# Altium footprint library Miscellaneous THD.PcbLib: 216 footprints (part 12 of 15)
Each footprint in its own frame and in the unit in brackets; x right, y up, seen from the top. Pads: shape width x height; smd on the part's side, far side on the other; paste and mask are expansions set on the pad; w line width, h text height; cw(c..) or ccw(c..) is an arc to the next point about the centre after c.
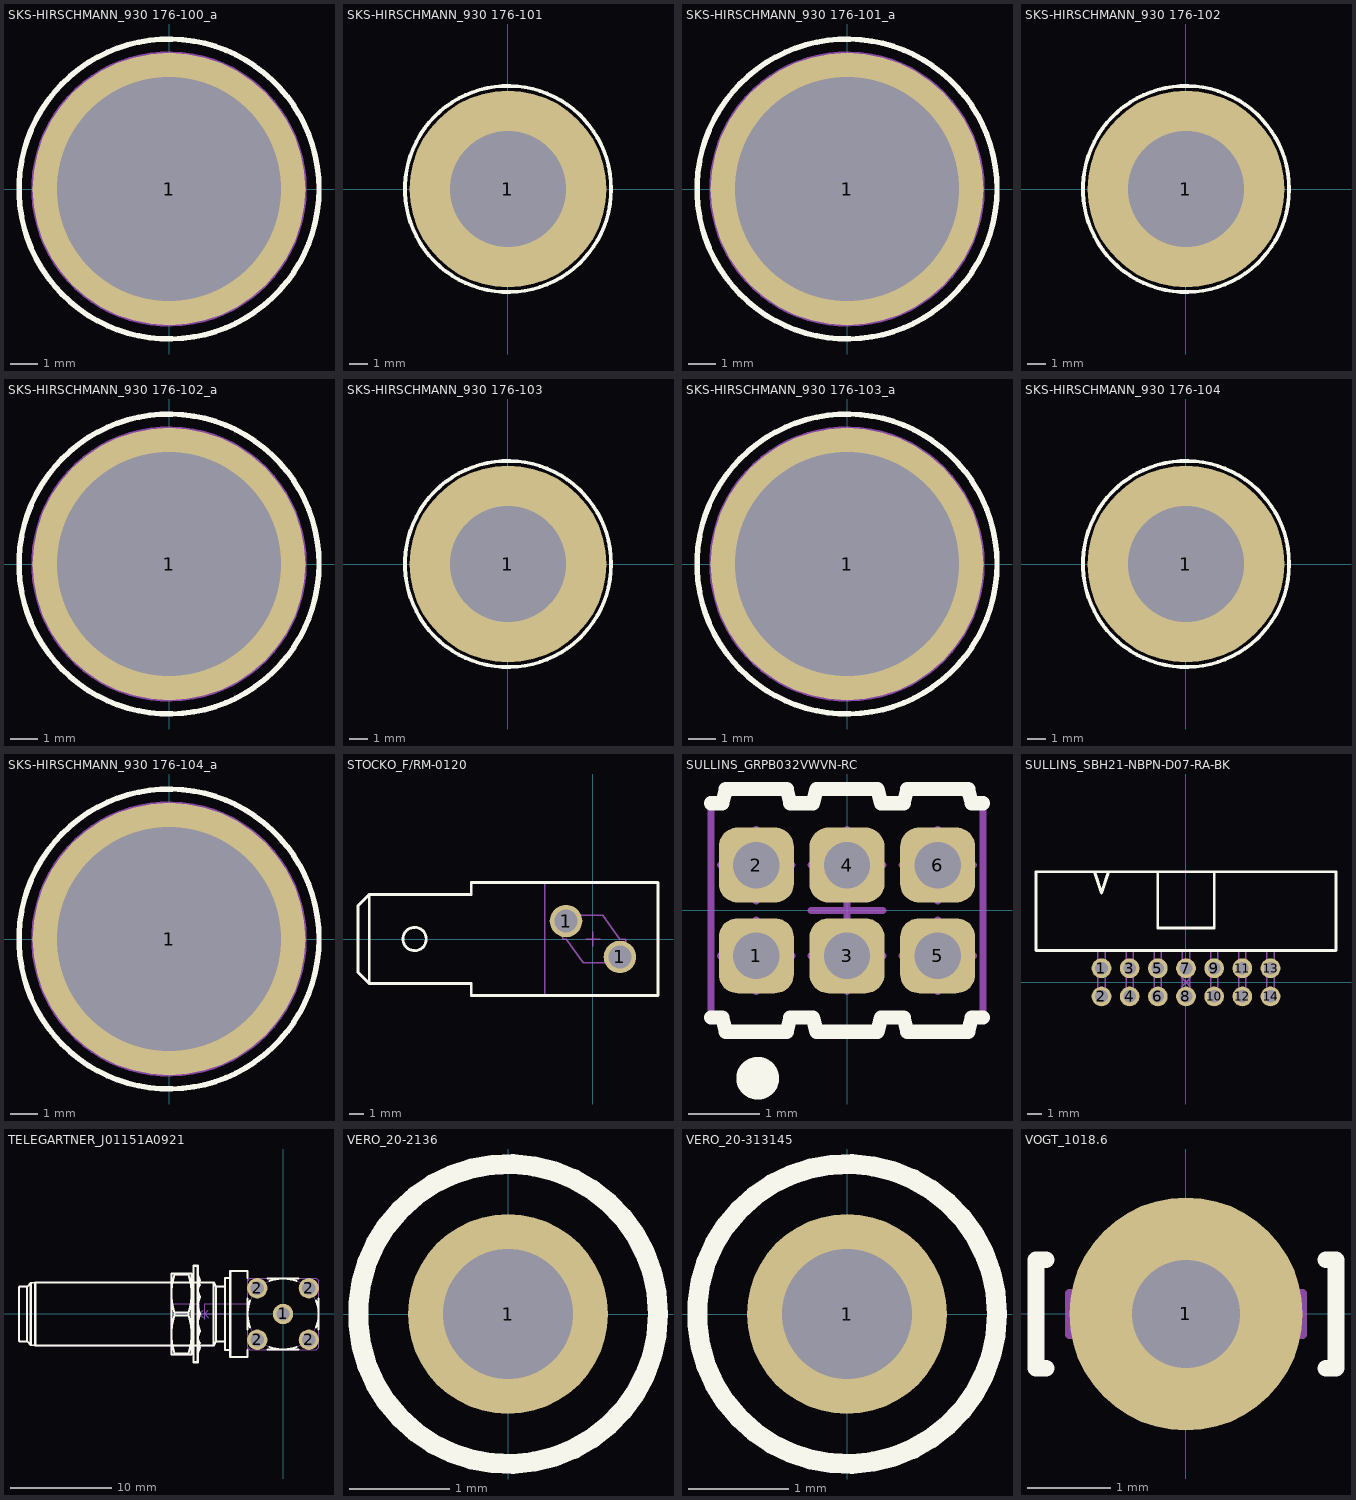
[diagram p11: the footprints below, top view; thin cyan lines are the x and y axes]

## SKS-HIRSCHMANN_930 176-100_a [mm] "Black Socket For Banana 4mm"
height 5
pads (1):
  round 10 hole 8.2: 1(0,0)
Top Overlay:
  circle w0.2: c0,0 r5.5
Mechanical 14:
  circle w0.1: c0,0 r5
  circle w0.1: c0,0 r2
  circle w0.1: c0.003,-0.002 r3
3D body "SKS-HIRSCHMANN_930 176-100_a_Part1.stp": height 5, standoff -18.5, extent -5,-4.997 5,4.997
3D body "SKS-HIRSCHMANN_930 176-100_a_Part2.stp": height -1.6, standoff -9.9, extent -5,-4.999 5,4.999

## SKS-HIRSCHMANN_930 176-101 [mm] "Red Socket For Banana 4mm"
height 9.3
pads (1):
  round 10.5 hole 6.2: 1(0,0)
Top Overlay:
  circle w0.2: c0,0 r5.5
Bottom Overlay:
  circle w0.2: c0,0 r8
Mechanical 14:
  circle w0.1: c0.003,-0.002 r3
  circle w0.1: c0,0 r2
  circle w0.1: c0,0 r5
3D body "SKS-HIRSCHMANN_930 176-101_Part1.stp": height 9.3, standoff -14.2, extent -5,-4.997 5,4.997
3D body "SKS-HIRSCHMANN_930 176-101_Part2.stp": height -1.6, standoff -5.6, extent -4.347,-4.5 4.347,4.5

## SKS-HIRSCHMANN_930 176-101_a [mm] "Red Socket For Banana 4mm"
height 5
pads (1):
  round 10 hole 8.2: 1(0,0)
Top Overlay:
  circle w0.2: c0,0 r5.5
Mechanical 14:
  circle w0.1: c0.003,-0.002 r3
  circle w0.1: c0,0 r2
  circle w0.1: c0,0 r5
3D body "SKS-HIRSCHMANN_930 176-101_a_Part1.stp": height 5, standoff -18.5, extent -5,-4.997 5,4.997
3D body "SKS-HIRSCHMANN_930 176-101_a_Part2.stp": height -1.6, standoff -9.9, extent -5,-4.999 5,4.999

## SKS-HIRSCHMANN_930 176-102 [mm] "Blue Socket For Banana 4mm"
height 9.3
pads (1):
  round 10.5 hole 6.2: 1(0,0)
Top Overlay:
  circle w0.2: c0,0 r5.5
Bottom Overlay:
  circle w0.2: c0,0 r8
Mechanical 14:
  circle w0.1: c0,0 r5
  circle w0.1: c0,0 r2
  circle w0.1: c0.002,0.003 r3
3D body "SKS-HIRSCHMANN_930 176-102_Part1.stp": height 9.3, standoff -14.2, extent -5,-4.997 5,4.997
3D body "SKS-HIRSCHMANN_930 176-102_Part2.stp": height -1.6, standoff -5.6, extent -4.347,-4.5 4.347,4.5

## SKS-HIRSCHMANN_930 176-102_a [mm] "Blue Socket For Banana 4mm"
height 5
pads (1):
  round 10 hole 8.2: 1(0,0)
Top Overlay:
  circle w0.2: c0,0 r5.5
Mechanical 14:
  circle w0.1: c0,0 r5
  circle w0.1: c0,0 r2
  circle w0.1: c0.003,-0.002 r3
3D body "SKS-HIRSCHMANN_930 176-102_a_Part1.stp": height 5, standoff -18.5, extent -5,-4.997 5,4.997
3D body "SKS-HIRSCHMANN_930 176-102_a_Part2.stp": height -1.6, standoff -9.9, extent -5,-4.999 5,4.999

## SKS-HIRSCHMANN_930 176-103 [mm] "Yellow Socket For Banana 4mm"
height 9.3
pads (1):
  round 10.5 hole 6.2: 1(0,0)
Top Overlay:
  circle w0.2: c0,0 r5.5
Bottom Overlay:
  circle w0.2: c0,0 r8
Mechanical 14:
  circle w0.1: c0.002,0.003 r3
  circle w0.1: c0,0 r2
  circle w0.1: c0,0 r5
3D body "SKS-HIRSCHMANN_930 176-103_Part2.stp": height -1.6, standoff -5.6, extent -4.347,-4.5 4.347,4.5
3D body "SKS-HIRSCHMANN_930 176-103_Part1.stp": height 9.3, standoff -14.2, extent -5,-4.997 5,4.997

## SKS-HIRSCHMANN_930 176-103_a [mm] "Yellow Socket For Banana 4mm"
height 5
pads (1):
  round 10 hole 8.2: 1(0,0)
Top Overlay:
  circle w0.2: c0,0 r5.5
Mechanical 14:
  circle w0.1: c0,0 r5
  circle w0.1: c0,0 r2
  circle w0.1: c0.003,-0.002 r3
3D body "SKS-HIRSCHMANN_930 176-103_a_Part2.stp": height -1.6, standoff -9.9, extent -5,-4.999 5,4.999
3D body "SKS-HIRSCHMANN_930 176-103_a_Part1.stp": height 5, standoff -18.5, extent -5,-4.997 5,4.997

## SKS-HIRSCHMANN_930 176-104 [mm] "Green Socket For Banana 4mm"
height 9.3
pads (1):
  round 10.5 hole 6.2: 1(0,0)
Top Overlay:
  circle w0.2: c0,0 r5.5
Bottom Overlay:
  circle w0.2: c0,0 r8
Mechanical 14:
  circle w0.1: c0.002,0.003 r3
  circle w0.1: c0,0 r2
  circle w0.1: c0,0 r5
3D body "SKS-HIRSCHMANN_930 176-104_Part2.stp": height -1.6, standoff -5.6, extent -4.347,-4.5 4.347,4.5
3D body "SKS-HIRSCHMANN_930 176-104_Part1.stp": height 9.3, standoff -14.2, extent -5,-4.997 5,4.997

## SKS-HIRSCHMANN_930 176-104_a [mm] "Green Socket For Banana 4mm"
height 5
pads (1):
  round 10 hole 8.2: 1(0,0)
Top Overlay:
  circle w0.2: c0,0 r5.5
Mechanical 14:
  circle w0.1: c0,0 r5
  circle w0.1: c0,0 r2
  circle w0.1: c0.003,-0.002 r3
3D body "SKS-HIRSCHMANN_930 176-104_a_Part2.stp": height -1.6, standoff -9.9, extent -5,-4.999 5,4.999
3D body "SKS-HIRSCHMANN_930 176-104_a_Part1.stp": height 5, standoff -18.5, extent -5,-4.997 5,4.997

## STOCKO_F/RM-0120 [mm] "6.35mm x 0.8mm PCB Horizontal Terminal Tab"
height 2.8
pads (2):
  round 2.3 hole 1.6: 1(-1.905,1.27) 1(1.905,-1.27)
Top Overlay:
  circle w0.2: c-12.605,0 r0.825
  lines w0.2: -15.805,-3.15 -15.805,3.15 ; -15.805,-3.15 -8.605,-3.15 -8.605,-4 4.595,-4 4.595,4 -8.605,4 -8.605,3.15 -15.805,3.15 ; -15.805,-3.15 -16.605,-2.35 -16.605,2.35 -15.805,3.15
Mechanical 8:
  lines w0.1: -2.405,1.27 -1.905,1.27 ; -1.905,0.77 -1.905,1.27 ; -1.905,1.77 -1.905,1.27 ; -1.405,1.27 -1.905,1.27 ; -0.5,0 0,0 ; 0,-0.5 0,0 ; 0,0.5 0,0 ; 0.5,0 0,0 ; 1.405,-1.27 1.905,-1.27 ; 1.905,-1.77 1.905,-1.27 ; 1.905,-0.77 1.905,-1.27 ; 2.405,-1.27 1.905,-1.27
Mechanical 14:
  circle w0.1: c-12.605,0 r0.825
  lines w0.1: -3.405,-4 -3.405,4 ; -15.805,-3.15 -15.805,3.15 ; -15.805,-3.15 -16.605,-2.35 -16.605,2.35 -15.805,3.15 ; -15.805,-3.15 -8.605,-3.15 -8.605,-4 4.595,-4 4.595,4 -8.605,4 -8.605,3.15 -15.805,3.15 ; -2.144,0 -1.905,0 -0.705,-1.67 1.505,-1.67 1.505,-0.87 2.305,-0.87 2.305,0 1.905,0 0.705,1.67 -1.505,1.67 -1.505,0.87 -2.144,0.87 -2.144,0
3D body "STOCKO_F-RM-0120.stp": height 2.8, standoff -3.7, extent -16.605,-4 4.595,4

## SULLINS_GRPB032VWVN-RC [mm] "6 Contacts - Pitch 1.27mm - Dual Row Straight Strip Header - Insulator 1mm"
height 4
pads (6):
  rrect50% 1.05x1.05 hole 0.65: 1(-1.27,-0.635) 2(-1.27,0.635) 3(0,-0.635) 4(0,0.635) 5(1.27,-0.635) 6(1.27,0.635)
Top Overlay:
  circle w0.3: c-1.25,-2.35 r0.15
  lines w0.2: -1.905,-1.5 -1.746,-1.5 -1.696,-1.7 -0.844,-1.7 -0.794,-1.5 -0.476,-1.5 -0.426,-1.7 0.426,-1.7 0.476,-1.5 0.794,-1.5 0.844,-1.7 1.696,-1.7 1.746,-1.5 1.905,-1.5 ; -1.905,1.5 -1.746,1.5 -1.696,1.7 -0.844,1.7 -0.794,1.5 -0.476,1.5 -0.426,1.7 0.426,1.7 0.476,1.5 0.794,1.5 0.844,1.7 1.696,1.7 1.746,1.5 1.905,1.5
Mechanical 8:
  lines w0.1: -1.77,-0.635 -1.27,-0.635 ; -1.77,0.635 -1.27,0.635 ; -1.27,-1.135 -1.27,-0.635 ; -1.27,-0.135 -1.27,-0.635 ; -1.27,0.135 -1.27,0.635 ; -1.27,1.135 -1.27,0.635 ; -0.77,-0.635 -1.27,-0.635 ; -0.77,0.635 -1.27,0.635 ; -0.5,-0.635 0,-0.635 ; -0.5,0 0,0 ; -0.5,0.635 0,0.635 ; 0,-1.135 0,-0.635 ; 0,-0.5 0,0 ; 0,0.5 0,0 ; 0,1.135 0,0.635 ; 0.5,-0.635 0,-0.635 ; 0.5,0 0,0 ; 0.5,0.635 0,0.635 ; 0.77,-0.635 1.27,-0.635 ; 0.77,0.635 1.27,0.635 ; 1.27,-1.135 1.27,-0.635 ; 1.27,-0.135 1.27,-0.635 ; 1.27,0.135 1.27,0.635 ; 1.27,1.135 1.27,0.635 ; 1.77,-0.635 1.27,-0.635 ; 1.77,0.635 1.27,0.635
Mechanical 14:
  lines w0.1: -1.47,-0.835 -1.37,-0.735 ; -1.47,-0.835 -1.07,-0.835 ; -1.47,-0.835 -1.47,-0.435 ; -1.47,-0.435 -1.37,-0.535 ; -1.47,-0.435 -1.07,-0.435 ; -1.47,0.435 -1.37,0.535 ; -1.47,0.435 -1.07,0.435 ; -1.47,0.435 -1.47,0.835 ; -1.47,0.835 -1.37,0.735 ; -1.47,0.835 -1.07,0.835 ; -1.37,-0.735 -1.37,-0.535 ; -1.37,-0.735 -1.17,-0.735 ; -1.37,-0.535 -1.17,-0.535 ; -1.37,0.535 -1.37,0.735 ; -1.37,0.535 -1.17,0.535 ; -1.37,0.735 -1.17,0.735 ; -1.17,-0.735 -1.07,-0.835 ; -1.17,-0.735 -1.17,-0.535 ; -1.17,-0.535 -1.07,-0.435 ; -1.17,0.535 -1.07,0.435 ; -1.17,0.535 -1.17,0.735 ; -1.17,0.735 -1.07,0.835 ; -1.07,-0.835 -1.07,-0.435 ; -1.07,0.435 -1.07,0.835 ; -0.2,-0.835 -0.1,-0.735 ; -0.2,-0.835 0.2,-0.835 ; -0.2,-0.835 -0.2,-0.435 ; -0.2,-0.435 -0.1,-0.535 ; -0.2,-0.435 0.2,-0.435 ; -0.2,0.435 -0.1,0.535 ; -0.2,0.435 0.2,0.435 ; -0.2,0.435 -0.2,0.835 ; -0.2,0.835 -0.1,0.735 ; -0.2,0.835 0.2,0.835 ; -0.1,-0.735 -0.1,-0.535 ; -0.1,-0.735 0.1,-0.735 ; -0.1,-0.535 0.1,-0.535 ; -0.1,0.535 -0.1,0.735 ; -0.1,0.535 0.1,0.535 ; -0.1,0.735 0.1,0.735 ; 0.1,-0.735 0.2,-0.835 ; 0.1,-0.735 0.1,-0.535 ; 0.1,-0.535 0.2,-0.435 ; 0.1,0.535 0.2,0.435 ; 0.1,0.535 0.1,0.735 ; 0.1,0.735 0.2,0.835 ; 0.2,-0.835 0.2,-0.435 ; 0.2,0.435 0.2,0.835 ; 1.07,-0.835 1.17,-0.735 ; 1.07,-0.835 1.47,-0.835 ; 1.07,-0.835 1.07,-0.435 ; 1.07,-0.435 1.17,-0.535 ; 1.07,-0.435 1.47,-0.435 ; 1.07,0.435 1.17,0.535 ; 1.07,0.435 1.47,0.435 ; 1.07,0.435 1.07,0.835 ; 1.07,0.835 1.17,0.735 ; 1.07,0.835 1.47,0.835 ; 1.17,-0.735 1.17,-0.535 ; 1.17,-0.735 1.37,-0.735 ; 1.17,-0.535 1.37,-0.535 ; 1.17,0.535 1.17,0.735 ; 1.17,0.535 1.37,0.535 ; 1.17,0.735 1.37,0.735 ; 1.37,-0.735 1.47,-0.835 ; 1.37,-0.735 1.37,-0.535 ; 1.37,-0.535 1.47,-0.435 ; 1.37,0.535 1.47,0.435 ; 1.37,0.535 1.37,0.735 ; 1.37,0.735 1.47,0.835 ; 1.47,-0.835 1.47,-0.435 ; 1.47,0.435 1.47,0.835 ; -1.905,-1.5 -1.905,1.5 -1.746,1.5 -1.696,1.7 -0.844,1.7 -0.794,1.5 -0.476,1.5 -0.426,1.7 0.426,1.7 0.476,1.5 0.794,1.5 0.844,1.7 1.696,1.7 1.746,1.5 1.905,1.5 1.905,-1.5 1.746,-1.5 1.696,-1.7 0.844,-1.7 0.794,-1.5 0.476,-1.5 0.426,-1.7 -0.426,-1.7 -0.476,-1.5 -0.794,-1.5 -0.844,-1.7 -1.696,-1.7 -1.746,-1.5 -1.905,-1.5
3D body "SULLINS_GRPB032VWVN-RC.stp": height 4, standoff -2.3, extent -1.905,-1.7 1.905,1.7

## SULLINS_SBH21-NBPN-D07-RA-BK [mm] "14 Contacts, Pitch 2mm, Right Angled Dual Row Male Shrouded Box Header"
height 5.4
pads (14):
  round 1.4 hole 0.9: 1(-6,1) 2(-6,-1) 3(-4,1) 4(-4,-1) 5(-2,1) 6(-2,-1) 7(0,1) 8(0,-1) 9(2,1) 10(2,-1) 11(4,1) 12(4,-1) 13(6,1) 14(6,-1)
Top Overlay:
  lines w0.2: -6.5,7.85 -6,6.35 -5.5,7.85 ; -2,7.85 -2,3.85 2,3.85 2,7.85 ; -10.65,2.25 10.65,2.25 10.65,7.85 -10.65,7.85 -10.65,2.25
Mechanical 8:
  lines w0.1: -6.5,-1 -6,-1 ; -6.5,1 -6,1 ; -6,-1.5 -6,-1 ; -6,-0.5 -6,-1 ; -6,0.5 -6,1 ; -6,1.5 -6,1 ; -5.5,-1 -6,-1 ; -5.5,1 -6,1 ; -4.5,-1 -4,-1 ; -4.5,1 -4,1 ; -4,-1.5 -4,-1 ; -4,-0.5 -4,-1 ; -4,0.5 -4,1 ; -4,1.5 -4,1 ; -3.5,-1 -4,-1 ; -3.5,1 -4,1 ; -2.5,-1 -2,-1 ; -2.5,1 -2,1 ; -2,-1.5 -2,-1 ; -2,-0.5 -2,-1 ; -2,0.5 -2,1 ; -2,1.5 -2,1 ; -1.5,-1 -2,-1 ; -1.5,1 -2,1 ; -0.5,-1 0,-1 ; -0.5,1 0,1 ; -0.353,-0.354 0,0 ; -0.353,0.354 0,0 ; 0,-1.5 0,-1 ; 0,-0.5 0,-1 ; 0,0.5 0,1 ; 0,1.5 0,1 ; 0.354,-0.354 0,0 ; 0.354,0.354 0,0 ; 0.5,-1 0,-1 ; 0.5,1 0,1 ; 1.5,-1 2,-1 ; 1.5,1 2,1 ; 2,-1.5 2,-1 ; 2,-0.5 2,-1 ; 2,0.5 2,1 ; 2,1.5 2,1 ; 2.5,-1 2,-1 ; 2.5,1 2,1 ; 3.5,-1 4,-1 ; 3.5,1 4,1 ; 4,-1.5 4,-1 ; 4,-0.5 4,-1 ; 4,0.5 4,1 ; 4,1.5 4,1 ; 4.5,-1 4,-1 ; 4.5,1 4,1 ; 5.5,-1 6,-1 ; 5.5,1 6,1 ; 6,-1.5 6,-1 ; 6,-0.5 6,-1 ; 6,0.5 6,1 ; 6,1.5 6,1 ; 6.5,-1 6,-1 ; 6.5,1 6,1
Mechanical 14:
  lines w0.1: -6.5,7.85 -6,6.35 -5.5,7.85 ; -6.25,2.25 -6.25,-1.25 -5.75,-1.25 -5.75,2.25 ; -4.25,2.25 -4.25,-1.25 -3.75,-1.25 -3.75,2.25 ; -2.25,2.25 -2.25,-1.25 -1.75,-1.25 -1.75,2.25 ; -2,7.85 -2,3.85 2,3.85 2,7.85 ; -0.25,2.25 -0.25,-1.25 0.25,-1.25 0.25,2.25 ; 1.75,2.25 1.75,-1.25 2.25,-1.25 2.25,2.25 ; 3.75,2.25 3.75,-1.25 4.25,-1.25 4.25,2.25 ; 5.75,2.25 5.75,-1.25 6.25,-1.25 6.25,2.25 ; -10.65,2.25 10.65,2.25 10.65,7.85 -10.65,7.85 -10.65,2.25
3D body "SULLINS_SBH21-NBPN-D07-RA-BK.stp": height 5.4, standoff -2.8, extent -10.65,-1.25 10.65,7.85

## TELEGARTNER_J01151A0921 [mm] "50 Ohm SMA Right Angle PCB Jack"
height 10.65
pads (5):
  round 2 hole 1.3: 1(0,0) 2(-2.54,-2.54) 2(-2.54,2.54) 2(2.54,-2.54) 2(2.54,2.54)
Top Overlay:
  lines w0.2: -10.683,-4 -10.683,-3.875 ; -10.683,4 -10.683,3.875 ; -9.317,-4 -9.317,-3.875 ; -9.317,4 -9.317,3.875 ; -8.8,-4 -9,-3.312 -8.8,-3.253 ; -8.8,-3.464 -9,-2.868 -8.8,-2.374 ; -8.8,-2.306 -9,-1.656 -8.8,-0.906 ; -8.8,-0.813 -9,0 -8.8,0.813 ; -8.8,0.906 -9,1.656 -8.8,2.299 ; -8.8,2.367 -9,2.868 -8.8,3.464 ; -8.8,3.253 -9,3.312 -8.8,4 ; -8.4,-4 -8.2,-3.312 -8.4,-3.253 ; -8.4,-3.464 -8.2,-2.868 -8.4,-2.366 ; -8.4,-2.316 -8.2,-1.656 -8.4,-0.894 ; -8.4,-0.825 -8.2,0 -8.4,0.817 ; -8.4,0.886 -8.2,1.656 -8.4,2.31 ; -8.4,2.36 -8.2,2.868 -8.4,3.415 ; -8.4,3.253 -8.2,3.312 -8.4,4 ; -5.7,-2.7 -6.6,-2.7 ; -5.7,2.7 -6.6,2.7 ; -5.2,-3.55 -5.7,-3.55 -5.7,3.55 -5.2,3.55 ; -3.5,-3.559 -3.5,-4.25 -5.2,-4.25 -5.2,4.25 -3.5,4.25 -3.5,3.559 ; -3.5,-1.521 -3.5,1.521 ; -3.239,-1.327 cw(c0,0) -3.239,1.327 ; -1.521,-3.5 1.521,-3.5 ; -1.521,3.5 1.521,3.5 ; -1.327,-3.239 ccw(c0,0) 1.327,-3.239 ; -1.327,3.239 cw(c0,0) 1.327,3.239 ; 3.239,-1.327 ccw(c0,0) 3.239,1.327 ; 3.5,-1.521 3.5,1.521 ; -25.2,-2.7 -24.842,-3.058 ; -25.2,-2.7 -25.9,-2.7 cw(c-25.9,-2.6) -26,-2.6 -26,2.6 cw(c-25.9,2.6) -25.9,2.7 -25.2,2.7 ; -25.2,-2.7 -25.2,2.7 ; -25.2,2.7 -24.842,3.058 ; -24.842,-3.058 -24.4,-3.12 ; -24.842,-3.058 -24.842,3.058 ; -24.842,3.058 -24.4,3.12 ; -24.4,-3.12 -6.842,-3.12 ; -24.4,-3.12 -24.4,3.12 ; -24.4,3.12 -6.842,3.12 ; -10.683,-3.875 cw(c-5.289,-2) -10.683,-0.125 ; -10.683,-3.875 -9.317,-3.875 ; -10.683,-0.125 -9.317,-0.125 ; -10.683,-0.125 -10.683,0.125 ; -10.683,0.125 cw(c-5.289,2) -10.683,3.875 ; -10.683,0.125 -9.317,0.125 ; -10.683,3.875 -9.317,3.875 ; -9.317,-3.875 ccw(c-14.711,-2) -9.317,-0.125 ; -9.317,-0.125 -9.317,0.125 ; -9.317,0.125 ccw(c-14.711,2) -9.317,3.875 ; -6.842,-3.12 -6.6,-2.7 ; -6.842,-3.12 -6.842,3.12 ; -6.842,3.12 -6.6,2.7 ; -6.6,-2.7 -6.6,2.7 ; -11,-4 -9,-4 -9,4 -11,4 -11,-4 ; -8.8,-4.75 -8.4,-4.75 -8.4,4.75 -8.8,4.75 -8.8,-4.75
Mechanical 8:
  lines w0.1: -11,1 -8.2,1 -8.2,0.5 -8.2,0 ; -8.7,0 -8.2,0 ; -8.2,-0.5 -8.2,0 ; -7.846,-0.354 -8.2,0 ; -7.846,0.354 -8.2,0 ; -7.7,-0.5 -7.7,0 ; -7.346,-0.354 -7.7,0 ; -7.346,0.354 -7.7,0 ; -7.2,0 -7.7,0 ; -5.2,-0.25 -5.2,0.25 ; -5.2,0 -7.7,0 ; -3.25,1 -7.7,1 -7.7,0.5 -7.7,0 ; -3.04,-2.54 -2.54,-2.54 ; -3.04,2.54 -2.54,2.54 ; -2.54,-3.04 -2.54,-2.54 ; -2.54,-2.04 -2.54,-2.54 ; -2.54,2.04 -2.54,2.54 ; -2.54,3.04 -2.54,2.54 ; -2.04,-2.54 -2.54,-2.54 ; -2.04,2.54 -2.54,2.54 ; -0.5,0 0,0 ; 0,-0.5 0,0 ; 0,0.5 0,0 ; 0.5,0 0,0 ; 2.04,-2.54 2.54,-2.54 ; 2.04,2.54 2.54,2.54 ; 2.54,-3.04 2.54,-2.54 ; 2.54,-2.04 2.54,-2.54 ; 2.54,2.04 2.54,2.54 ; 2.54,3.04 2.54,2.54 ; 3.04,-2.54 2.54,-2.54 ; 3.04,2.54 2.54,2.54 ; -8.2,0 -7.7,0
  text "2.5mm" at -7.7,1.281 h1
  text "3mm" at -11.747,1.281 h1
Mechanical 14:
  circle w0.1: c0,0 r3.5
  lines w0.1: -10.683,-4 -10.683,-3.875 ; -10.683,4 -10.683,3.875 ; -9.317,-4 -9.317,-3.875 ; -9.317,4 -9.317,3.875 ; -8.8,-4 -9,-3.312 -8.8,-3.253 ; -8.8,-3.464 -9,-2.868 -8.8,-2.374 ; -8.8,-2.306 -9,-1.656 -8.8,-0.906 ; -8.8,-0.813 -9,0 -8.8,0.813 ; -8.8,0.906 -9,1.656 -8.8,2.299 ; -8.8,2.367 -9,2.868 -8.8,3.464 ; -8.8,3.253 -9,3.312 -8.8,4 ; -8.4,-4 -8.2,-3.312 -8.4,-3.253 ; -8.4,-3.464 -8.2,-2.868 -8.4,-2.366 ; -8.4,-2.316 -8.2,-1.656 -8.4,-0.894 ; -8.4,-0.825 -8.2,0 -8.4,0.817 ; -8.4,0.886 -8.2,1.656 -8.4,2.31 ; -8.4,2.36 -8.2,2.868 -8.4,3.415 ; -8.4,3.253 -8.2,3.312 -8.4,4 ; -5.7,-2.7 -6.6,-2.7 ; -5.7,2.7 -6.6,2.7 ; -5.2,-3.55 -5.7,-3.55 -5.7,3.55 -5.2,3.55 ; -3.5,-3.285 -3.285,-3.5 3.285,-3.5 3.5,-3.285 3.5,3.285 3.285,3.5 -3.285,3.5 -3.5,3.285 ; -25.2,-2.7 -24.842,-3.058 ; -25.2,-2.7 -25.9,-2.7 cw(c-25.9,-2.6) -26,-2.6 -26,2.6 cw(c-25.9,2.6) -25.9,2.7 -25.2,2.7 ; -25.2,-2.7 -25.2,2.7 ; -25.2,2.7 -24.842,3.058 ; -24.842,-3.058 -24.4,-3.12 ; -24.842,-3.058 -24.842,3.058 ; -24.842,3.058 -24.4,3.12 ; -24.4,-3.12 -24.4,3.12 ; -24.4,-3.12 -6.842,-3.12 ; -24.4,3.12 -6.842,3.12 ; -10.683,-3.875 cw(c-5.289,-2) -10.683,-0.125 ; -10.683,-3.875 -9.317,-3.875 ; -10.683,-0.125 -9.317,-0.125 ; -10.683,-0.125 -10.683,0.125 ; -10.683,0.125 cw(c-5.289,2) -10.683,3.875 ; -10.683,0.125 -9.317,0.125 ; -10.683,3.875 -9.317,3.875 ; -9.317,-3.875 ccw(c-14.711,-2) -9.317,-0.125 ; -9.317,-0.125 -9.317,0.125 ; -9.317,0.125 ccw(c-14.711,2) -9.317,3.875 ; -6.842,-3.12 -6.6,-2.7 ; -6.842,-3.12 -6.842,3.12 ; -6.842,3.12 -6.6,2.7 ; -6.6,-2.7 -6.6,2.7 ; -11,-4 -9,-4 -9,4 -11,4 -11,-4 ; -8.8,-4.75 -8.4,-4.75 -8.4,4.75 -8.8,4.75 -8.8,-4.75 ; -5.2,-4.25 -3.5,-4.25 -3.5,4.25 -5.2,4.25 -5.2,-4.25
3D body "TELEGARTNER_J01151A0921_Part1.stp": height 10.65, standoff -3, extent -26,-4.25 3.5,4.25
3D body "TELEGARTNER_J01151A0921_Part2.stp": height 11.15, standoff 1.65, extent -11,-4.75 -8.2,4.75

## VERO_20-2136 [mm] "Black Bead PCB Terminal Test Pin (1.32 mm hole)"
height 5.4
pads (1):
  round 2 hole 1.3: 1(0,0)
Top Overlay:
  circle w0.2: c0,0 r1.5
Mechanical 14:
  circle w0.1: c0,0 r1.5
3D body "VERO_20-2136.stp": height 5.4, standoff -3.17, extent -1.5,-1.5 1.5,1.5

## VERO_20-313145 [mm] "Black Bead PCB Terminal Test Pin (1.32 mm hole) for 2.4mm  PCB Thickness"
height 5.4
pads (1):
  round 2 hole 1.3: 1(0,0)
Top Overlay:
  circle w0.2: c0,0 r1.5
Mechanical 14:
  circle w0.1: c0,0 r1.5
3D body "VERO_20-313145.stp": height 5.4, standoff -3.62, extent -1.5,-1.5 1.5,1.5

## VOGT_1018.6 [mm] "Soldering Lug for PCB ( hole 1.3 mm)"
height 4.5
pads (1):
  round 2.8 hole 1.3: 1(0,0)
Top Overlay:
  lines w0.2: -1.678,-0.65 -1.8,-0.65 -1.8,0.65 -1.678,0.65 ; 1.679,-0.65 1.8,-0.65 1.8,0.65 1.679,0.65
Mechanical 8:
  lines w0.1: -0.5,0 0,0 ; 0,-0.5 0,0 ; 0,0.5 0,0 ; 0.5,0 0,0
Mechanical 14:
  lines w0.1: -1.4,-0.25 1.4,-0.25 1.4,0.25 -1.4,0.25 -1.4,-0.25
3D body "VOGT_1018.6.stp": height 4.5, standoff -6.84, extent -1.4,-0.25 1.4,0.25